# Altium integrated library Cap-Tant-THP_V2.IntLib: 5 symbols
Pins are listed as number, name and electrical type; pins without a type are passive.

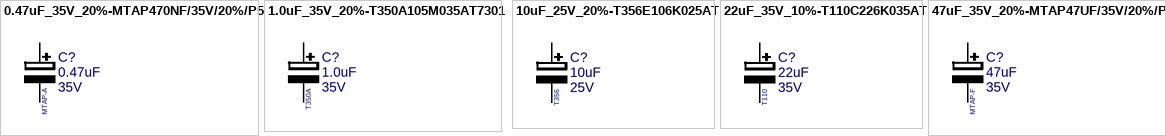
[diagram p0: symbols 0.47uF_35V_20%-MTAP470NF/35V/20%/P5 to 47uF_35V_20%-MTAP47UF/35V/20%/P5]

## 0.47uF_35V_20%-MTAP470NF/35V/20%/P5
designator C?, comment value 0.47uF  Voltage: 35V  Text1: MTAP-A  (hidden comment: MTAP470NF/35V/20%/P5)
Cap Tantalum Radial; Manufacturer: MEC; Board Tech: THP; Tol: 20%; Watt: *; Part Number: MTAP470NF/35V/20%/P5; Package: TANT-RADIAL-4.5x8.0; EDM-PN: *; Text2: *; Component Height: 8.0mm
footprint TANT-RADIAL-4.5x8.0 (TANT Radial 4.5x8.0mm)
pins: 1, 2

## 1.0uF_35V_20%-T350A105M035AT7301
designator C?, comment value 1.0uF  Voltage: 35V  Text1: T350A  (hidden comment: T350A105M035AT7301)
Cap Tantalum Radial; Manufacturer: Kemet; Board Tech: THP; Tol: 20%; Watt: *; Part Number: T350A105M035AT7301; Package: TANT-RADIAL-4.5x8.0; EDM-PN: *; Text2: *; Component Height: 8.0mm
footprint TANT-RADIAL-4.5x8.0 (TANT Radial 4.5x8.0mm)
pins: 1, 2

## 10uF_25V_20%-T356E106K025AT
designator C?, comment value 10uF  Voltage: 25V  Text1: T356  (hidden comment: T356E106K025AT)
Cap Tantalum Radial; Manufacturer: Kemet; Board Tech: THP; Tol: 20%; Reutech PN: 5910-CA-0001; Watt: *; Part Number: T356E106K025AT; Package: TANT-RADIAL-5.5x10.2; EDM-PN: *; Text2: *; Component Height: 10.2mm
footprint TANT-RADIAL-5.5x10.2 (TANT Radial 5.5x10.2mm)
pins: 1, 2

## 22uF_35V_10%-T110C226K035AT
designator C?, comment value 22uF  Voltage: 35V  Text1: T110  (hidden comment: T110C226K035AT)
Cap Tantalum Axial; Manufacturer: Kemet; Board Tech: THP; Tol: 10%; Reutech PN: 5910-SG-0756; Watt: *; Part Number: T110C226K035AT; Package: T110-C; EDM-PN: *; Text2: *; Component Height: 7.34mm
footprint TANT-T110-C (TANT T110-C 17.42x7.34mm)
pins: 1, 2

## 47uF_35V_20%-MTAP47UF/35V/20%/P5
designator C?, comment value 47uF  Voltage: 35V  Text1: MTAP-F  (hidden comment: MTAP47UF/35V/20%/P5)
Cap Tantalum Radial; Manufacturer: MEC; Board Tech: THP; Tol: 20%; Watt: *; Part Number: MTAP47UF/35V/20%/P5; Package: TANT-RADIAL-11x17.5; EDM-PN: *; Text2: *; Component Height: 8.0mm
footprint TANT-RADIAL-11x17.5 (TANT Radial 11.-x17.5mm)
pins: 1, 2